# Altium footprint library hphonglib.PcbLib: 1250 footprints (part 60 of 79)
Each footprint in its own frame and in the unit in brackets; x right, y up, seen from the top. Pads: shape width x height; smd on the part's side, far side on the other; paste and mask are expansions set on the pad; w line width, h text height; cw(c..) or ccw(c..) is an arc to the next point about the centre after c.
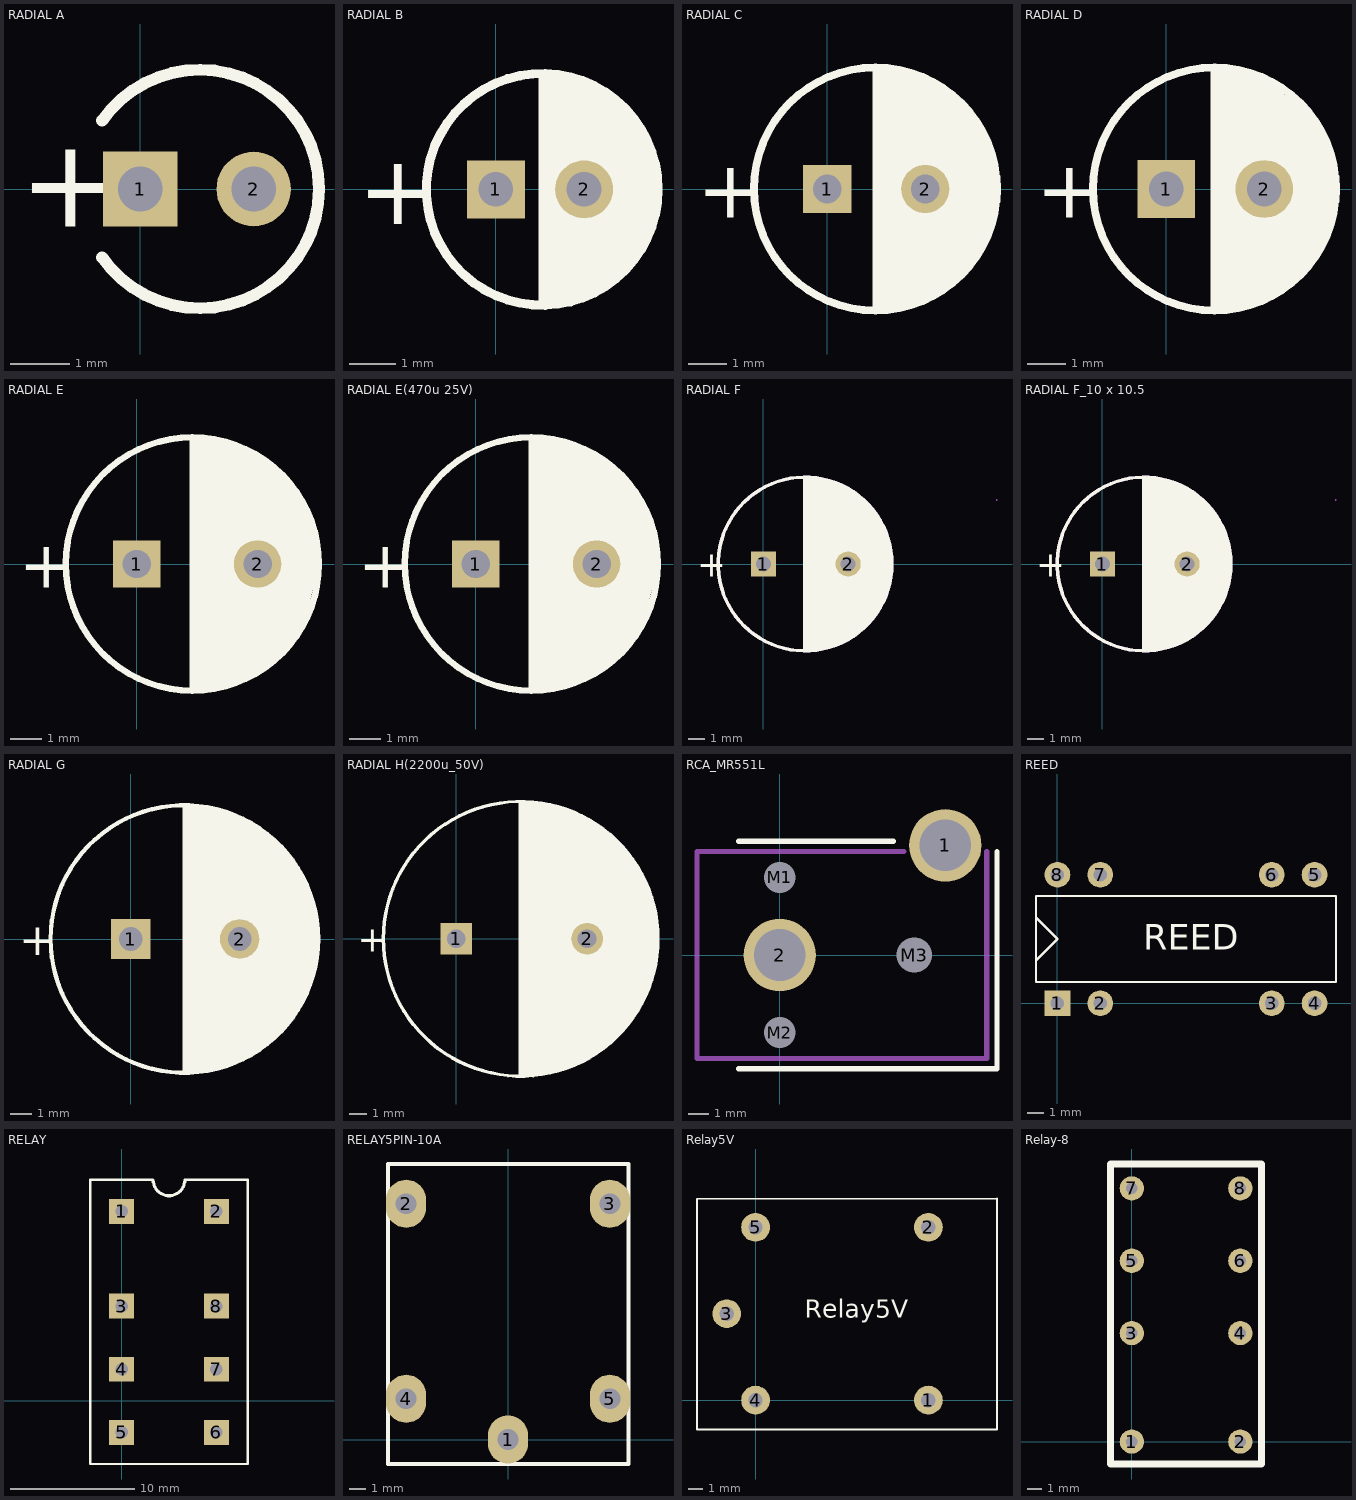
[diagram p59: the footprints below, top view; thin cyan lines are the x and y axes]

## RADIAL A [mm] "Capacitor, Electrolytic, Radial; Body 4 x 6.8 mm (Dia.xH typ); Pin Spacing 2 mm (typ)"
height 7.8
pads (2):
  rect 1.25x1.25 hole 0.75: 1(0,0)
  round 1.25 hole 0.75: 2(1.905,0)
Top Overlay:
  lines w0.2: -0.638,-1.147 ccw(c1,0) 3,0 ccw(c1,0) -0.638,1.147
  text "+" at -2.032,-0.635 h1.5
Bottom Overlay:
  lines w0.2: -0.638,-1.147 ccw(c1,0) 3,0 ccw(c1,0) -0.638,1.147

## RADIAL B [mm] "Capacitor, Electrolytic, Radial; Body 5 x 6.8 mm (Dia.xH typ); Pin Spacing 2 mm (typ)"
height 7.8
pads (2):
  rect 1.25x1.25 hole 0.75: 1(0,0)
  round 1.25 hole 0.75: 2(1.905,0)
Top Overlay:
  circle w0.2: c1,0 r2.5
  region: 1.041,2.515 2.057,2.286 2.972,1.549 3.429,0.584 3.404,-0.686 2.921,-1.626 2.261,-2.159 1.448,-2.464 1.016,-2.489 1.016,2.489
  lines w0.2: 1.016,-2.464 1.016,2.489
  text "+" at -2.975,-0.75 h1.5
Bottom Overlay:
  circle w0.2: c1,0 r2.5
  text "+" at -2.975,-0.75 h1.5
3D body "Cap 5x11.STEP": height 11, standoff -19, extent -1.484,-2.489 3.516,2.511

## RADIAL C [mm] "Capacitor, Electrolytic, Radial; Body 6.3 x 6.8 mm (Dia.xH typ); Pin Spacing 2.5 mm (typ)"
height 7.8
pads (2):
  rect 1.25x1.25 hole 0.75: 1(0,0)
  round 1.25 hole 0.75: 2(2.54,0)
Top Overlay:
  circle w0.2: c1.25,0 r3.15
  region: 1.27,3.124 2.464,2.921 3.607,2.083 4.293,0.864 4.318,-0.66 3.81,-1.829 2.769,-2.743 2.083,-3.073 1.27,-3.15
  lines w0.2: 1.245,3.124 1.27,3.124 1.27,-3.124
  text "+" at -3.375,-0.75 h1.5
Bottom Overlay:
  circle w0.2: c1.25,0 r3.15
  text "+" at -3.375,-0.75 h1.5
3D body "C radial 254 .step": height 13.7, standoff -1.4, extent -1.27,-2.539 3.808,2.54

## RADIAL D [mm] "Capacitor, Electrolytic, Radial; Body 6.3 x 9.8 mm (Dia.xH typ); Pin Spacing 2.5 mm (typ)"
height 10.8
pads (2):
  rect 1.5x1.5 hole 0.9: 1(0,0)
  round 1.5 hole 0.9: 2(2.54,0)
Top Overlay:
  circle w0.2: c1.25,0 r3.15
  region: 1.219,3.15 2.388,2.946 3.531,2.108 4.242,1.118 4.343,-0.559 3.734,-1.88 2.819,-2.718 1.727,-3.124 1.245,-3.124 1.245,3.124
  lines w0.2: 1.245,-3.15 1.245,3.15 1.27,3.15
  text "+" at -3.375,-0.75 h1.5
Bottom Overlay:
  circle w0.2: c1.25,0 r3.15
  text "+" at -3.375,-0.75 h1.5

## RADIAL E [mm] "Capacitor, Electrolytic, Radial; Body 8 x 10.5 mm (Dia.xH typ); Pin Spacing 3.5 mm (typ)"
height 11.5
pads (2):
  rect 1.5x1.5 hole 0.9: 1(0,0)
  round 1.5 hole 0.9: 2(3.81,0)
Top Overlay:
  circle w0.2: c1.75,0 r4
  region: 1.753,3.988 3.2,3.759 4.597,2.794 5.41,1.651 5.74,-0.051 5.283,-1.854 4.521,-2.921 3.175,-3.785 1.753,-3.988
  lines w0.2: 1.753,-3.988 1.753,3.988 1.778,3.988
  text "+" at -3.725,-0.75 h1.5
Bottom Overlay:
  circle w0.2: c1.75,0 r4
  text "+" at -3.725,-0.75 h1.5
3D body "CAP 8X11_5.STEP": height 11.74, standoff -18.75, extent -2.235,-3.988 5.765,4.012

## RADIAL E(470u 25V) [mm] "Capacitor, Electrolytic, Radial; Body 8 x 10.5 mm (Dia.xH typ); Pin Spacing 3.5 mm (typ)"
height 11.5
pads (2):
  rect 1.5x1.5 hole 0.9: 1(0,0)
  round 1.5 hole 0.9: 2(3.81,0)
Top Overlay:
  circle w0.2: c1.75,0 r4
  region: 1.753,3.988 3.2,3.759 4.597,2.794 5.41,1.651 5.74,-0.051 5.283,-1.854 4.521,-2.921 3.175,-3.785 1.753,-3.988
  lines w0.2: 1.753,-3.988 1.753,3.988 1.778,3.988
  text "+" at -3.725,-0.75 h1.5
Bottom Overlay:
  circle w0.2: c1.75,0 r4
  text "+" at -3.725,-0.75 h1.5
3D body: height 14, standoff 0.1, extent -2.15,-3.9 5.65,3.9
3D body: height 14.1, standoff 0.11, extent -1.25,-3.05 4.775,3.05
3D body: height 14.12, standoff 0.9, extent 4.475,-1.75 5.675,1.55

## RADIAL F [mm] "Capacitor, Electrolytic, Radial; Body 10 x 10.5 mm (Dia.xH typ); Pin Spacing 5 mm (typ)"
height 11.5
pads (2):
  rect 1.5x1.5 hole 0.9: 1(0,0)
  round 1.5 hole 0.9: 2(5.08,0)
Top Overlay:
  circle w0.2: c2.5,0 r5.207
  region: 2.489,-5.182 3.607,-5.08 4.826,-4.674 5.969,-3.835 7.01,-2.718 7.468,-1.6 7.747,-0.102 7.544,1.372 6.934,2.718 6.274,3.581 5.08,4.547 3.607,5.105 2.515,5.207 2.489,5.207
  lines w0.2: 2.489,5.182 2.489,-5.207 2.54,-5.207
  text "+" at -3.975,-0.75 h1.5
Bottom Overlay:
  circle w0.2: c2.5,0 r5.207
Mechanical 3:
  circle w0.025: c13.97,3.835 r0.025
Mechanical 13:
  circle w0.2: c2.5,0 r5.207
3D body: height 11.48, standoff 0.03, extent -2.54,-5.08 7.5,5.08
3D body: height 11.48, standoff 0.03, extent 7.239,-1.575 7.544,1.245
3D body: height 11.51, standoff 11.46, extent -1.401,-3.785 6.244,3.81
3D body: height 3, standoff 0, extent -0.25,-0.246 0.25,0.254
3D body: height 2, standoff 0, extent 4.83,-0.246 5.33,0.254

## RADIAL F_10 x 10.5 [mm] "Capacitor, Electrolytic, Radial; Body 10 x 10.5 mm (Dia.xH typ); Pin Spacing 5 mm (typ)"
height 11.5
pads (2):
  rect 1.5x1.5 hole 0.9: 1(0,0)
  round 1.5 hole 0.9: 2(5.08,0)
Top Overlay:
  circle w0.2: c2.5,0 r5.207
  region: 2.489,-5.182 3.607,-5.08 4.826,-4.674 5.969,-3.835 7.01,-2.718 7.468,-1.6 7.747,-0.102 7.544,1.372 6.934,2.718 6.274,3.581 5.08,4.547 3.607,5.105 2.515,5.207 2.489,5.207
  lines w0.2: 2.489,5.182 2.489,-5.207 2.54,-5.207
  text "+" at -3.975,-0.75 h1.5
Bottom Overlay:
  circle w0.2: c2.5,0 r5.207
Mechanical 3:
  circle w0.025: c13.97,3.835 r0.025
Mechanical 13:
  circle w0.2: c2.5,0 r5.207
3D body "CAP 10X20.STEP": height 19.99, standoff -19, extent -2.405,-5.004 7.595,4.996

## RADIAL G [mm] "Capacitor, Electrolytic, Radial; Body 12.5 x 22 mm (Dia.xH typ); Pin Spacing 5 mm (typ)"
height 23
pads (2):
  rect 1.85x1.85 hole 1.1: 1(0,0)
  round 1.85 hole 1.1: 2(5.08,0)
Top Overlay:
  circle w0.2: c2.5,0 r6.25
  region: 2.515,6.248 4.013,6.071 5.715,5.334 6.858,4.496 7.722,3.48 8.382,2.108 8.788,0.229 8.585,-1.448 7.95,-2.972 7.163,-4.14 6.071,-5.156 4.216,-6.02 2.489,-6.248
  lines w0.2: 2.515,-6.223 2.515,6.248
  text "+" at -5.225,-0.75 h1.5
Bottom Overlay:
  circle w0.2: c2.5,0 r6.25
  text "+" at -0.6,1.55 h1.5
3D body "Cap12_5x20.STEP": height 20.99, standoff -18, extent -3.658,-6.274 8.842,6.226

## RADIAL H(2200u_50V) [mm] "Capacitor, Electrolytic, Radial; Body 16 x 25 mm (Dia.xH typ); Pin Spacing 7.5 mm (typ)"
height 26
pads (2):
  rect 1.85x1.85 hole 1.1: 1(0,0)
  round 1.85 hole 1.1: 2(7.62,0)
Top Overlay:
  circle w0.2: c3.75,0 r8
  region: 3.759,7.976 5.41,7.823 7.264,7.137 8.941,6.121 10.516,4.242 11.608,1.753 11.735,-0.254 11.379,-2.337 10.719,-3.962 9.525,-5.563 8.052,-6.782 6.248,-7.645 4.445,-8.026 3.734,-7.95 3.734,8.001
  lines w0.2: 3.734,-7.976 3.734,7.976
  text "+" at -5.725,-0.75 h1.5
Bottom Overlay:
  circle w0.2: c3.75,0 r8
  text "+" at 1.895,-0.75 h1.5
3D body: height 32.12, standoff 0.09, extent 9.075,-3.15 11.85,3.025
3D body: height 32.01, standoff 0.11, extent -2.075,-5.775 9.55,5.775
3D body: height 32, standoff 0.1, extent -4.25,-8.025 11.825,8

## RCA_MR551L [mm] "Schurter RCA PCB Socket (Farnell 152-396)"
pads (5):
  round 3.5 hole 2.5: 1(8,5.3) 2(0,0)
  round 1.3 hole 1.5 unplated: M1(0,3.75) M2(0,-3.75)
  round 1.5 hole 1.7 unplated: M3(6.5,0)
Top Overlay:
  lines w0.254: -2,-5.5 10.5,-5.5 10.5,5 ; -2,5.5 5.5,5.5
Mechanical 1:
  lines w0.254: 6,5 -4,5 -4,-5 10,-5 10,5

## REED [mil]
pads (8):
  rect 60x60 hole 31.49: 1(0,0)
  round 60 hole 31.49: 2(100,0) 3(500,0) 4(600,0) 5(600,300) 6(500,300) 7(100,300) 8(0,300)
Top Overlay:
  lines w5: -50,100 0,150 -50,200 ; -50,50 650,50 650,250 -50,250 -50,50
  text "REED" at 200,125 h60

## RELAY [mm]
pads (8):
  rect 2x2 hole 1: 1(0,15.24) 2(7.62,15.24) 3(0,7.62) 4(0,2.54) 5(0,-2.54) 6(7.62,-2.54) 7(7.62,2.54) 8(7.62,7.62)
Top Overlay:
  lines w0.2: 2.413,17.78 -2.54,17.78 -2.54,-5.08 10.16,-5.08 10.16,17.78 5.08,17.78
  lines w0.254: 2.534,17.78 ccw(c3.81,17.78) 5.086,17.78
3D body "User Library-8PIN-Relay.step": height 12.3, standoff -3, extent -1.09,-4.05 8.71,16.75

## RELAY5PIN-10A [mm]
pads (5):
  oval 2.5x3 hole 1.3: 1(0,0) 2(-6.35,14.7) 3(6.35,14.7) 4(-6.35,2.54) 5(6.35,2.54)
Top Overlay:
  lines w0.254: -7.493,-1.524 -7.493,17.176 7.507,17.176 7.507,-1.524 -7.493,-1.524
3D body: height 16, standoff 0, extent -7.493,-1.524 7.493,17.145

## Relay5V [mm]
pads (5):
  round 2 hole 1 unplated: 1(12,0) 2(12,12) 3(-2,6) 4(0,0) 5(0,12)
Top Overlay:
  lines w0.127: -4.064,-2.032 16.764,-2.032 16.764,13.992 -4.064,13.957 -4.064,-2.032
  text "Relay5V" at 3.429,5.715 h1.27

## Relay-8 [mil] "Relay; 8 Leads; Solder Pad 35mil"
pads (8):
  round 67 hole 32: 1(0,0) 2(300,0) 3(0,300) 4(300,300) 5(0,500) 6(300,500) 7(0,700) 8(300,700)
Top Overlay:
  lines w19.68: -58.5,-62 -58.5,767.5 358,767.5 358,-62 -58.5,-62
3D body "User Library-OMRON G5V-2 - Relay Chico.step": height 453.15, standoff -157.28, extent -47,-51.04 346.7,756.04